# Altium schematic symbol library jlcpcb_2025_04_capacitors_extended_0805.schlib: 3281 symbols (part 15 of 18)
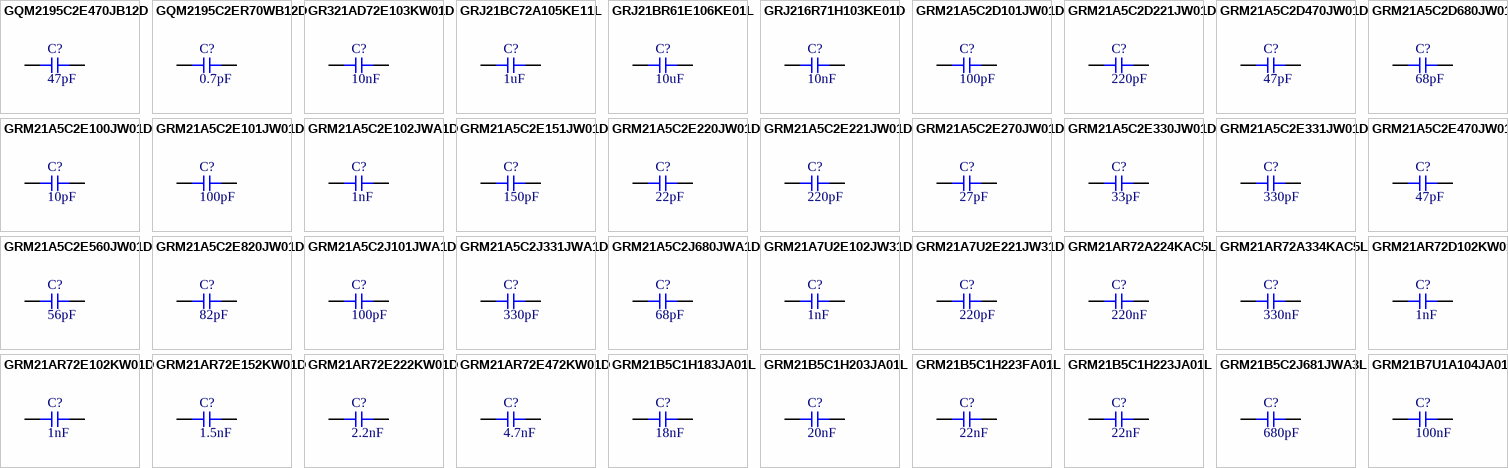
[diagram p96: symbols GQM2195C2E470JB12D to GRM21B7U1A104JA01L]

## GRM21A5C2E102JWA1D
designator C?  Capacitance: 1nF  (hidden comment: *)
Capacitor, Ceramic (MLCC), 1nF, ±5%, 250V, null, ±5%, SMD 0805; Manufacturer: Murata Electronics; Manufacturer Part Number: GRM21A5C2E102JWA1D; Package Size: 0805; JLCPCB Basic Part: No; JLCPCB Part Number: C909887; Supplier 1: LCSC; Category: Capacitors - MLCC; Supplier Part Number 1: C909887; Tolerance: ±5%; Voltage Rating: 250V; Temperature Coefficient: null; RoHS: Yes; ComponentLink1Description: Datasheet; ComponentLink1URL: https://wmsc.lcsc.com/wmsc/upload/file/pdf/v2/lcsc/2304140030_Murata-Electronics-GRM21A5C2E102JWA1D_C909887.pdf; ComponentLink2Description: JLCPCB Part URL; ComponentLink2URL: https://jlcpcb.com/partdetail/C909887; ComponentLink3Description: LCSC Part URL; ComponentLink3URL: https://lcsc.com/product-detail/Multilayer-Ceramic-Capacitors-MLCC---SMD-SMT_Murata-Electronics-Murata-Electronics-GRM21A5C2E102JWA1D_C909887.html
footprint CAP-0805 (0805 (2012M) Capacitor)
pins: 1, 2

## GRM21A5C2E151JW01D
designator C?  Capacitance: 150pF  (hidden comment: *)
Capacitor, Ceramic (MLCC), 150pF, ±5%, 250V, null, ±5%, SMD 0805; Manufacturer: Murata Electronics; Manufacturer Part Number: GRM21A5C2E151JW01D; Package Size: 0805; JLCPCB Basic Part: No; JLCPCB Part Number: C701191; Supplier 1: LCSC; Category: Capacitors - MLCC; Supplier Part Number 1: C701191; Tolerance: ±5%; Voltage Rating: 250V; Temperature Coefficient: null; RoHS: Yes; ComponentLink1Description: Datasheet; ComponentLink1URL: https://wmsc.lcsc.com/wmsc/upload/file/pdf/v2/lcsc/2011072005_Murata-Electronics-GRM21A5C2E151JW01D_C701191.pdf; ComponentLink2Description: JLCPCB Part URL; ComponentLink2URL: https://jlcpcb.com/partdetail/C701191; ComponentLink3Description: LCSC Part URL; ComponentLink3URL: https://lcsc.com/product-detail/Multilayer-Ceramic-Capacitors-MLCC---SMD-SMT_Murata-Electronics-Murata-Electronics-GRM21A5C2E151JW01D_C701191.html
footprint CAP-0805 (0805 (2012M) Capacitor)
pins: 1, 2

## GRM21A5C2E220JW01D
designator C?  Capacitance: 22pF  (hidden comment: *)
Capacitor, Ceramic (MLCC), 22pF, ±5%, 250V, null, ±5%, SMD 0805; Manufacturer: Murata Electronics; Manufacturer Part Number: GRM21A5C2E220JW01D; Package Size: 0805; JLCPCB Basic Part: No; JLCPCB Part Number: C668358; Supplier 1: LCSC; Category: Capacitors - MLCC; Supplier Part Number 1: C668358; Tolerance: ±5%; Voltage Rating: 250V; Temperature Coefficient: null; RoHS: Yes; ComponentLink1Description: Datasheet; ComponentLink1URL: https://wmsc.lcsc.com/wmsc/upload/file/pdf/v2/lcsc/2301311008_Murata-Electronics-GRM21A5C2E220JW01D_C668358.pdf; ComponentLink2Description: JLCPCB Part URL; ComponentLink2URL: https://jlcpcb.com/partdetail/C668358; ComponentLink3Description: LCSC Part URL; ComponentLink3URL: https://lcsc.com/product-detail/Multilayer-Ceramic-Capacitors-MLCC---SMD-SMT_Murata-Electronics-Murata-Electronics-GRM21A5C2E220JW01D_C668358.html
footprint CAP-0805 (0805 (2012M) Capacitor)
pins: 1, 2

## GRM21A5C2E221JW01D
designator C?  Capacitance: 220pF  (hidden comment: *)
Capacitor, Ceramic (MLCC), 220pF, ±5%, 250V, C0G, ±5%, SMD 0805; Manufacturer: Murata Electronics; Manufacturer Part Number: GRM21A5C2E221JW01D; Package Size: 0805; JLCPCB Basic Part: No; JLCPCB Part Number: C437547; Supplier 1: LCSC; Category: Capacitors - MLCC; Supplier Part Number 1: C437547; Tolerance: ±5%; Voltage Rating: 250V; Temperature Coefficient: C0G; RoHS: Yes; ComponentLink1Description: Datasheet; ComponentLink1URL: https://wmsc.lcsc.com/wmsc/upload/file/pdf/v2/lcsc/2001111409_Murata-Electronics-GRM21A5C2E221JW01D_C437547.pdf; ComponentLink2Description: JLCPCB Part URL; ComponentLink2URL: https://jlcpcb.com/partdetail/C437547; ComponentLink3Description: LCSC Part URL; ComponentLink3URL: https://lcsc.com/product-detail/Multilayer-Ceramic-Capacitors-MLCC---SMD-SMT_Murata-Electronics-Murata-Electronics-GRM21A5C2E221JW01D_C437547.html
footprint CAP-0805 (0805 (2012M) Capacitor)
pins: 1, 2

## GRM21A5C2E270JW01D
designator C?  Capacitance: 27pF  (hidden comment: *)
Capacitor, Ceramic (MLCC), 27pF, ±5%, 250V, C0G, ±5%, SMD 0805; Manufacturer: Murata Electronics; Manufacturer Part Number: GRM21A5C2E270JW01D; Package Size: 0805; JLCPCB Basic Part: No; JLCPCB Part Number: C710969; Supplier 1: LCSC; Category: Capacitors - MLCC; Supplier Part Number 1: C710969; Tolerance: ±5%; Voltage Rating: 250V; Temperature Coefficient: C0G; RoHS: Yes; ComponentLink1Description: Datasheet; ComponentLink1URL: https://wmsc.lcsc.com/wmsc/upload/file/pdf/v2/lcsc/2202161830_Murata-Electronics-GRM21A5C2E270JW01D_C710969.pdf; ComponentLink2Description: JLCPCB Part URL; ComponentLink2URL: https://jlcpcb.com/partdetail/C710969; ComponentLink3Description: LCSC Part URL; ComponentLink3URL: https://lcsc.com/product-detail/Multilayer-Ceramic-Capacitors-MLCC---SMD-SMT_Murata-Electronics-Murata-Electronics-GRM21A5C2E270JW01D_C710969.html
footprint CAP-0805 (0805 (2012M) Capacitor)
pins: 1, 2

## GRM21A5C2E330JW01D
designator C?  Capacitance: 33pF  (hidden comment: *)
Capacitor, Ceramic (MLCC), 33pF, ±5%, 250V, C0G, ±5%, SMD 0805; Manufacturer: Murata Electronics; Manufacturer Part Number: GRM21A5C2E330JW01D; Package Size: 0805; JLCPCB Basic Part: No; JLCPCB Part Number: C437548; Supplier 1: LCSC; Category: Capacitors - MLCC; Supplier Part Number 1: C437548; Tolerance: ±5%; Voltage Rating: 250V; Temperature Coefficient: C0G; RoHS: Yes; ComponentLink1Description: Datasheet; ComponentLink1URL: https://wmsc.lcsc.com/wmsc/upload/file/pdf/v2/lcsc/2304140030_Murata-Electronics-GRM21A5C2E330JW01D_C437548.pdf; ComponentLink2Description: JLCPCB Part URL; ComponentLink2URL: https://jlcpcb.com/partdetail/C437548; ComponentLink3Description: LCSC Part URL; ComponentLink3URL: https://lcsc.com/product-detail/Multilayer-Ceramic-Capacitors-MLCC---SMD-SMT_Murata-Electronics-Murata-Electronics-GRM21A5C2E330JW01D_C437548.html
footprint CAP-0805 (0805 (2012M) Capacitor)
pins: 1, 2

## GRM21A5C2E331JW01D
designator C?  Capacitance: 330pF  (hidden comment: *)
Capacitor, Ceramic (MLCC), 330pF, ±5%, 250V, C0G, ±5%, SMD 0805; Manufacturer: Murata Electronics; Manufacturer Part Number: GRM21A5C2E331JW01D; Package Size: 0805; JLCPCB Basic Part: No; JLCPCB Part Number: C162305; Supplier 1: LCSC; Category: Capacitors - MLCC; Supplier Part Number 1: C162305; Tolerance: ±5%; Voltage Rating: 250V; Temperature Coefficient: C0G; RoHS: Yes; ComponentLink1Description: Datasheet; ComponentLink1URL: https://wmsc.lcsc.com/wmsc/upload/file/pdf/v2/lcsc/2304140030_Murata-Electronics-GRM21A5C2E331JW01D_C162305.pdf; ComponentLink2Description: JLCPCB Part URL; ComponentLink2URL: https://jlcpcb.com/partdetail/C162305; ComponentLink3Description: LCSC Part URL; ComponentLink3URL: https://lcsc.com/product-detail/Multilayer-Ceramic-Capacitors-MLCC---SMD-SMT_Murata-Electronics-Murata-Electronics-GRM21A5C2E331JW01D_C162305.html
footprint CAP-0805 (0805 (2012M) Capacitor)
pins: 1, 2

## GRM21A5C2E470JW01D
designator C?  Capacitance: 47pF  (hidden comment: *)
Capacitor, Ceramic (MLCC), 47pF, ±5%, 250V, C0G, ±5%, SMD 0805; Manufacturer: Murata Electronics; Manufacturer Part Number: GRM21A5C2E470JW01D; Package Size: 0805; JLCPCB Basic Part: No; JLCPCB Part Number: C437549; Supplier 1: LCSC; Category: Capacitors - MLCC; Supplier Part Number 1: C437549; Tolerance: ±5%; Voltage Rating: 250V; Temperature Coefficient: C0G; RoHS: Yes; ComponentLink1Description: Datasheet; ComponentLink1URL: https://wmsc.lcsc.com/wmsc/upload/file/pdf/v2/lcsc/2304140030_Murata-Electronics-GRM21A5C2E470JW01D_C437549.pdf; ComponentLink2Description: JLCPCB Part URL; ComponentLink2URL: https://jlcpcb.com/partdetail/C437549; ComponentLink3Description: LCSC Part URL; ComponentLink3URL: https://lcsc.com/product-detail/Multilayer-Ceramic-Capacitors-MLCC---SMD-SMT_Murata-Electronics-Murata-Electronics-GRM21A5C2E470JW01D_C437549.html
footprint CAP-0805 (0805 (2012M) Capacitor)
pins: 1, 2

## GRM21A5C2E560JW01D
designator C?  Capacitance: 56pF  (hidden comment: *)
Capacitor, Ceramic (MLCC), 56pF, ±5%, 250V, null, ±5%, SMD 0805; Manufacturer: Murata Electronics; Manufacturer Part Number: GRM21A5C2E560JW01D; Package Size: 0805; JLCPCB Basic Part: No; JLCPCB Part Number: C913752; Supplier 1: LCSC; Category: Capacitors - MLCC; Supplier Part Number 1: C913752; Tolerance: ±5%; Voltage Rating: 250V; Temperature Coefficient: null; RoHS: Yes; ComponentLink1Description: Datasheet; ComponentLink1URL: https://wmsc.lcsc.com/wmsc/upload/file/pdf/v2/lcsc/2201131300_Murata-Electronics-GRM21A5C2E560JW01D_C913752.pdf; ComponentLink2Description: JLCPCB Part URL; ComponentLink2URL: https://jlcpcb.com/partdetail/C913752; ComponentLink3Description: LCSC Part URL; ComponentLink3URL: https://lcsc.com/product-detail/Multilayer-Ceramic-Capacitors-MLCC---SMD-SMT_Murata-Electronics-Murata-Electronics-GRM21A5C2E560JW01D_C913752.html
footprint CAP-0805 (0805 (2012M) Capacitor)
pins: 1, 2

## GRM21A5C2E820JW01D
designator C?  Capacitance: 82pF  (hidden comment: *)
Capacitor, Ceramic (MLCC), 82pF, ±5%, 250V, C0G, ±5%, SMD 0805; Manufacturer: Murata Electronics; Manufacturer Part Number: GRM21A5C2E820JW01D; Package Size: 0805; JLCPCB Basic Part: No; JLCPCB Part Number: C710971; Supplier 1: LCSC; Category: Capacitors - MLCC; Supplier Part Number 1: C710971; Tolerance: ±5%; Voltage Rating: 250V; Temperature Coefficient: C0G; RoHS: Yes; ComponentLink1Description: Datasheet; ComponentLink1URL: https://wmsc.lcsc.com/wmsc/upload/file/pdf/v2/lcsc/2210190600_Murata-Electronics-GRM21A5C2E820JW01D_C710971.pdf; ComponentLink2Description: JLCPCB Part URL; ComponentLink2URL: https://jlcpcb.com/partdetail/C710971; ComponentLink3Description: LCSC Part URL; ComponentLink3URL: https://lcsc.com/product-detail/Multilayer-Ceramic-Capacitors-MLCC---SMD-SMT_Murata-Electronics-Murata-Electronics-GRM21A5C2E820JW01D_C710971.html
footprint CAP-0805 (0805 (2012M) Capacitor)
pins: 1, 2

## GRM21A5C2J101JWA1D
designator C?  Capacitance: 100pF  (hidden comment: *)
Capacitor, Ceramic (MLCC), 100pF, ±5%, 630V, C0G, ±5%, SMD 0805; Manufacturer: Murata Electronics; Manufacturer Part Number: GRM21A5C2J101JWA1D; Package Size: 0805; JLCPCB Basic Part: No; JLCPCB Part Number: C437551; Supplier 1: LCSC; Category: Capacitors - MLCC; Supplier Part Number 1: C437551; Tolerance: ±5%; Voltage Rating: 630V; Temperature Coefficient: C0G; RoHS: Yes; ComponentLink1Description: Datasheet; ComponentLink1URL: https://wmsc.lcsc.com/wmsc/upload/file/pdf/v2/lcsc/2304140030_Murata-Electronics-GRM21A5C2J101JWA1D_C437551.pdf; ComponentLink2Description: JLCPCB Part URL; ComponentLink2URL: https://jlcpcb.com/partdetail/C437551; ComponentLink3Description: LCSC Part URL; ComponentLink3URL: https://lcsc.com/product-detail/Multilayer-Ceramic-Capacitors-MLCC---SMD-SMT_Murata-Electronics-Murata-Electronics-GRM21A5C2J101JWA1D_C437551.html
footprint CAP-0805 (0805 (2012M) Capacitor)
pins: 1, 2

## GRM21A5C2J331JWA1D
designator C?  Capacitance: 330pF  (hidden comment: *)
Capacitor, Ceramic (MLCC), 330pF, ±5%, ±5%, SMD 0805; Manufacturer: Murata Electronics; Manufacturer Part Number: GRM21A5C2J331JWA1D; Package Size: 0805; JLCPCB Basic Part: No; JLCPCB Part Number: C883569; Supplier 1: LCSC; Category: Capacitors - MLCC; Supplier Part Number 1: C883569; Tolerance: ±5%; RoHS: Yes; ComponentLink1Description: Datasheet; ComponentLink1URL: https://wmsc.lcsc.com/wmsc/upload/file/pdf/v2/lcsc/2304140030_Murata-Electronics-GRM21A5C2J331JWA1D_C883569.pdf; ComponentLink2Description: JLCPCB Part URL; ComponentLink2URL: https://jlcpcb.com/partdetail/C883569; ComponentLink3Description: LCSC Part URL; ComponentLink3URL: https://lcsc.com/product-detail/Multilayer-Ceramic-Capacitors-MLCC---SMD-SMT_Murata-Electronics-Murata-Electronics-GRM21A5C2J331JWA1D_C883569.html
footprint CAP-0805 (0805 (2012M) Capacitor)
pins: 1, 2

## GRM21A5C2J680JWA1D
designator C?  Capacitance: 68pF  (hidden comment: *)
Capacitor, Ceramic (MLCC), 68pF, ±5%, 630V, C0G, ±5%, SMD 0805; Manufacturer: Murata Electronics; Manufacturer Part Number: GRM21A5C2J680JWA1D; Package Size: 0805; JLCPCB Basic Part: No; JLCPCB Part Number: C162306; Supplier 1: LCSC; Category: Capacitors - MLCC; Supplier Part Number 1: C162306; Tolerance: ±5%; Voltage Rating: 630V; Temperature Coefficient: C0G; RoHS: Yes; ComponentLink1Description: Datasheet; ComponentLink1URL: https://wmsc.lcsc.com/wmsc/upload/file/pdf/v2/lcsc/1810201250_Murata-Electronics-GRM21A5C2J680JWA1D_C162306.pdf; ComponentLink2Description: JLCPCB Part URL; ComponentLink2URL: https://jlcpcb.com/partdetail/C162306; ComponentLink3Description: LCSC Part URL; ComponentLink3URL: https://lcsc.com/product-detail/Multilayer-Ceramic-Capacitors-MLCC---SMD-SMT_Murata-Electronics-Murata-Electronics-GRM21A5C2J680JWA1D_C162306.html
footprint CAP-0805 (0805 (2012M) Capacitor)
pins: 1, 2

## GRM21A7U2E102JW31D
designator C?  Capacitance: 1nF  (hidden comment: *)
Capacitor, Ceramic (MLCC), 1nF, ±5%, 250V, U2J, ±5%, SMD 0805; Manufacturer: Murata Electronics; Manufacturer Part Number: GRM21A7U2E102JW31D; Package Size: 0805; JLCPCB Basic Part: No; JLCPCB Part Number: C162307; Supplier 1: LCSC; Category: Capacitors - MLCC; Supplier Part Number 1: C162307; Tolerance: ±5%; Voltage Rating: 250V; Temperature Coefficient: U2J; RoHS: Yes; ComponentLink1Description: Datasheet; ComponentLink1URL: https://wmsc.lcsc.com/wmsc/upload/file/pdf/v2/lcsc/1810201241_Murata-Electronics-GRM21A7U2E102JW31D_C162307.pdf; ComponentLink2Description: JLCPCB Part URL; ComponentLink2URL: https://jlcpcb.com/partdetail/C162307; ComponentLink3Description: LCSC Part URL; ComponentLink3URL: https://lcsc.com/product-detail/Multilayer-Ceramic-Capacitors-MLCC---SMD-SMT_Murata-Electronics-Murata-Electronics-GRM21A7U2E102JW31D_C162307.html
footprint CAP-0805 (0805 (2012M) Capacitor)
pins: 1, 2

## GRM21A7U2E221JW31D
designator C?  Capacitance: 220pF  (hidden comment: *)
Capacitor, Ceramic (MLCC), 220pF, ±5%, 250V, U2J, ±5%, SMD 0805; Manufacturer: Murata Electronics; Manufacturer Part Number: GRM21A7U2E221JW31D; Package Size: 0805; JLCPCB Basic Part: No; JLCPCB Part Number: C426641; Supplier 1: LCSC; Category: Capacitors - MLCC; Supplier Part Number 1: C426641; Tolerance: ±5%; Voltage Rating: 250V; Temperature Coefficient: U2J; RoHS: Yes; ComponentLink1Description: Datasheet; ComponentLink1URL: https://wmsc.lcsc.com/wmsc/upload/file/pdf/v2/lcsc/2304140030_Murata-Electronics-GRM21A7U2E221JW31D_C426641.pdf; ComponentLink2Description: JLCPCB Part URL; ComponentLink2URL: https://jlcpcb.com/partdetail/C426641; ComponentLink3Description: LCSC Part URL; ComponentLink3URL: https://lcsc.com/product-detail/Multilayer-Ceramic-Capacitors-MLCC---SMD-SMT_Murata-Electronics-Murata-Electronics-GRM21A7U2E221JW31D_C426641.html
footprint CAP-0805 (0805 (2012M) Capacitor)
pins: 1, 2

## GRM21AR72A224KAC5L
designator C?  Capacitance: 220nF  (hidden comment: *)
Capacitor, Ceramic (MLCC), 220nF, ±10%, 100V, X7R, ±10%, SMD 0805; Manufacturer: Murata Electronics; Manufacturer Part Number: GRM21AR72A224KAC5L; Package Size: 0805; JLCPCB Basic Part: No; JLCPCB Part Number: C913663; Supplier 1: LCSC; Category: Capacitors - MLCC; Supplier Part Number 1: C913663; Tolerance: ±10%; Voltage Rating: 100V; Temperature Coefficient: X7R; RoHS: Yes; ComponentLink1Description: Datasheet; ComponentLink1URL: https://wmsc.lcsc.com/wmsc/upload/file/pdf/v2/lcsc/2201131300_Murata-Electronics-GRM21AR72A224KAC5L_C913663.pdf; ComponentLink2Description: JLCPCB Part URL; ComponentLink2URL: https://jlcpcb.com/partdetail/C913663; ComponentLink3Description: LCSC Part URL; ComponentLink3URL: https://lcsc.com/product-detail/Multilayer-Ceramic-Capacitors-MLCC---SMD-SMT_Murata-Electronics-Murata-Electronics-GRM21AR72A224KAC5L_C913663.html
footprint CAP-0805 (0805 (2012M) Capacitor)
pins: 1, 2

## GRM21AR72A334KAC5L
designator C?  Capacitance: 330nF  (hidden comment: *)
Capacitor, Ceramic (MLCC), 330nF, ±10%, 100V, X7R, ±10%, SMD 0805; Manufacturer: Murata Electronics; Manufacturer Part Number: GRM21AR72A334KAC5L; Package Size: 0805; JLCPCB Basic Part: No; JLCPCB Part Number: C710977; Supplier 1: LCSC; Category: Capacitors - MLCC; Supplier Part Number 1: C710977; Tolerance: ±10%; Voltage Rating: 100V; Temperature Coefficient: X7R; RoHS: Yes; ComponentLink1Description: Datasheet; ComponentLink1URL: https://wmsc.lcsc.com/wmsc/upload/file/pdf/v2/lcsc/2203092030_Murata-Electronics-GRM21AR72A334KAC5L_C710977.pdf; ComponentLink2Description: JLCPCB Part URL; ComponentLink2URL: https://jlcpcb.com/partdetail/C710977; ComponentLink3Description: LCSC Part URL; ComponentLink3URL: https://lcsc.com/product-detail/Multilayer-Ceramic-Capacitors-MLCC---SMD-SMT_Murata-Electronics-Murata-Electronics-GRM21AR72A334KAC5L_C710977.html
footprint CAP-0805 (0805 (2012M) Capacitor)
pins: 1, 2

## GRM21AR72D102KW01D
designator C?  Capacitance: 1nF  (hidden comment: *)
Capacitor, Ceramic (MLCC), 1nF, ±10%, 200V, X7R, ±10%, SMD 0805; Manufacturer: Murata Electronics; Manufacturer Part Number: GRM21AR72D102KW01D; Package Size: 0805; JLCPCB Basic Part: No; JLCPCB Part Number: C162310; Supplier 1: LCSC; Category: Capacitors - MLCC; Supplier Part Number 1: C162310; Tolerance: ±10%; Voltage Rating: 200V; Temperature Coefficient: X7R; RoHS: Yes; ComponentLink1Description: Datasheet; ComponentLink1URL: https://wmsc.lcsc.com/wmsc/upload/file/pdf/v2/lcsc/2304140030_Murata-Electronics-GRM21AR72D102KW01D_C162310.pdf; ComponentLink2Description: JLCPCB Part URL; ComponentLink2URL: https://jlcpcb.com/partdetail/C162310; ComponentLink3Description: LCSC Part URL; ComponentLink3URL: https://lcsc.com/product-detail/Multilayer-Ceramic-Capacitors-MLCC---SMD-SMT_Murata-Electronics-Murata-Electronics-GRM21AR72D102KW01D_C162310.html
footprint CAP-0805 (0805 (2012M) Capacitor)
pins: 1, 2

## GRM21AR72E102KW01D
designator C?  Capacitance: 1nF  (hidden comment: *)
Capacitor, Ceramic (MLCC), 1nF, ±10%, 250V, X7R, ±10%, SMD 0805; Manufacturer: Murata Electronics; Manufacturer Part Number: GRM21AR72E102KW01D; Package Size: 0805; JLCPCB Basic Part: No; JLCPCB Part Number: C97911; Supplier 1: LCSC; Category: Capacitors - MLCC; Supplier Part Number 1: C97911; Tolerance: ±10%; Voltage Rating: 250V; Temperature Coefficient: X7R; RoHS: Yes; ComponentLink1Description: Datasheet; ComponentLink1URL: https://wmsc.lcsc.com/wmsc/upload/file/pdf/v2/lcsc/1811142010_Murata-Electronics-GRM21AR72E102KW01D_C97911.pdf; ComponentLink2Description: JLCPCB Part URL; ComponentLink2URL: https://jlcpcb.com/partdetail/C97911; ComponentLink3Description: LCSC Part URL; ComponentLink3URL: https://lcsc.com/product-detail/Multilayer-Ceramic-Capacitors-MLCC---SMD-SMT_Murata-Electronics-Murata-Electronics-GRM21AR72E102KW01D_C97911.html
footprint CAP-0805 (0805 (2012M) Capacitor)
pins: 1, 2

## GRM21AR72E152KW01D
designator C?  Capacitance: 1.5nF  (hidden comment: *)
Capacitor, Ceramic (MLCC), 1.5nF, ±10%, 250V, X7R, ±10%, SMD 0805; Manufacturer: Murata Electronics; Manufacturer Part Number: GRM21AR72E152KW01D; Package Size: 0805; JLCPCB Basic Part: No; JLCPCB Part Number: C185517; Supplier 1: LCSC; Category: Capacitors - MLCC; Supplier Part Number 1: C185517; Tolerance: ±10%; Voltage Rating: 250V; Temperature Coefficient: X7R; RoHS: Yes; ComponentLink1Description: Datasheet; ComponentLink1URL: https://wmsc.lcsc.com/wmsc/upload/file/pdf/v2/lcsc/2304140030_Murata-Electronics-GRM21AR72E152KW01D_C185517.pdf; ComponentLink2Description: JLCPCB Part URL; ComponentLink2URL: https://jlcpcb.com/partdetail/C185517; ComponentLink3Description: LCSC Part URL; ComponentLink3URL: https://lcsc.com/product-detail/Multilayer-Ceramic-Capacitors-MLCC---SMD-SMT_Murata-Electronics-Murata-Electronics-GRM21AR72E152KW01D_C185517.html
footprint CAP-0805 (0805 (2012M) Capacitor)
pins: 1, 2

## GRM21AR72E222KW01D
designator C?  Capacitance: 2.2nF  (hidden comment: *)
Capacitor, Ceramic (MLCC), 2.2nF, ±10%, 250V, X7R, ±10%, SMD 0805; Manufacturer: Murata Electronics; Manufacturer Part Number: GRM21AR72E222KW01D; Package Size: 0805; JLCPCB Basic Part: No; JLCPCB Part Number: C415382; Supplier 1: LCSC; Category: Capacitors - MLCC; Supplier Part Number 1: C415382; Tolerance: ±10%; Voltage Rating: 250V; Temperature Coefficient: X7R; RoHS: Yes; ComponentLink1Description: Datasheet; ComponentLink1URL: https://wmsc.lcsc.com/wmsc/upload/file/pdf/v2/lcsc/2304140030_Murata-Electronics-GRM21AR72E222KW01D_C415382.pdf; ComponentLink2Description: JLCPCB Part URL; ComponentLink2URL: https://jlcpcb.com/partdetail/C415382; ComponentLink3Description: LCSC Part URL; ComponentLink3URL: https://lcsc.com/product-detail/Multilayer-Ceramic-Capacitors-MLCC---SMD-SMT_Murata-Electronics-Murata-Electronics-GRM21AR72E222KW01D_C415382.html
footprint CAP-0805 (0805 (2012M) Capacitor)
pins: 1, 2

## GRM21AR72E472KW01D
designator C?  Capacitance: 4.7nF  (hidden comment: *)
Capacitor, Ceramic (MLCC), 4.7nF, ±10%, 250V, X7R, ±10%, SMD 0805; Manufacturer: Murata Electronics; Manufacturer Part Number: GRM21AR72E472KW01D; Package Size: 0805; JLCPCB Basic Part: No; JLCPCB Part Number: C415395; Supplier 1: LCSC; Category: Capacitors - MLCC; Supplier Part Number 1: C415395; Tolerance: ±10%; Voltage Rating: 250V; Temperature Coefficient: X7R; RoHS: Yes; ComponentLink1Description: Datasheet; ComponentLink1URL: https://wmsc.lcsc.com/wmsc/upload/file/pdf/v2/lcsc/2304140030_Murata-Electronics-GRM21AR72E472KW01D_C415395.pdf; ComponentLink2Description: JLCPCB Part URL; ComponentLink2URL: https://jlcpcb.com/partdetail/C415395; ComponentLink3Description: LCSC Part URL; ComponentLink3URL: https://lcsc.com/product-detail/Multilayer-Ceramic-Capacitors-MLCC---SMD-SMT_Murata-Electronics-Murata-Electronics-GRM21AR72E472KW01D_C415395.html
footprint CAP-0805 (0805 (2012M) Capacitor)
pins: 1, 2

## GRM21B5C1H183JA01L
designator C?  Capacitance: 18nF  (hidden comment: *)
Capacitor, Ceramic (MLCC), 18nF, ±5%, 50V, C0G, ±5%, SMD 0805; Manufacturer: Murata Electronics; Manufacturer Part Number: GRM21B5C1H183JA01L; Package Size: 0805; JLCPCB Basic Part: No; JLCPCB Part Number: C162313; Supplier 1: LCSC; Category: Capacitors - MLCC; Supplier Part Number 1: C162313; Tolerance: ±5%; Voltage Rating: 50V; Temperature Coefficient: C0G; RoHS: Yes; ComponentLink1Description: Datasheet; ComponentLink1URL: https://wmsc.lcsc.com/wmsc/upload/file/pdf/v2/lcsc/1810201242_Murata-Electronics-GRM21B5C1H183JA01L_C162313.pdf; ComponentLink2Description: JLCPCB Part URL; ComponentLink2URL: https://jlcpcb.com/partdetail/C162313; ComponentLink3Description: LCSC Part URL; ComponentLink3URL: https://lcsc.com/product-detail/Multilayer-Ceramic-Capacitors-MLCC---SMD-SMT_Murata-Electronics-Murata-Electronics-GRM21B5C1H183JA01L_C162313.html
footprint CAP-0805 (0805 (2012M) Capacitor)
pins: 1, 2

## GRM21B5C1H203JA01L
designator C?  Capacitance: 20nF  (hidden comment: *)
Capacitor, Ceramic (MLCC), 20nF, ±5%, 50V, null, ±5%, SMD 0805; Manufacturer: Murata Electronics; Manufacturer Part Number: GRM21B5C1H203JA01L; Package Size: 0805; JLCPCB Basic Part: No; JLCPCB Part Number: C2170407; Supplier 1: LCSC; Category: Capacitors - MLCC; Supplier Part Number 1: C2170407; Tolerance: ±5%; Voltage Rating: 50V; Temperature Coefficient: null; RoHS: Yes; ComponentLink1Description: Datasheet; ComponentLink1URL: https://wmsc.lcsc.com/wmsc/upload/file/pdf/v2/lcsc/2202040430_Murata-Electronics-GRM21B5C1H203JA01L_C2170407.pdf; ComponentLink2Description: JLCPCB Part URL; ComponentLink2URL: https://jlcpcb.com/partdetail/C2170407; ComponentLink3Description: LCSC Part URL; ComponentLink3URL: https://lcsc.com/product-detail/Multilayer-Ceramic-Capacitors-MLCC---SMD-SMT_Murata-Electronics-Murata-Electronics-GRM21B5C1H203JA01L_C2170407.html
footprint CAP-0805 (0805 (2012M) Capacitor)
pins: 1, 2

## GRM21B5C1H223FA01L
designator C?  Capacitance: 22nF  (hidden comment: *)
Capacitor, Ceramic (MLCC), 22nF, ±1%, 50V, null, ±1%, SMD 0805; Manufacturer: Murata Electronics; Manufacturer Part Number: GRM21B5C1H223FA01L; Package Size: 0805; JLCPCB Basic Part: No; JLCPCB Part Number: C2181592; Supplier 1: LCSC; Category: Capacitors - MLCC; Supplier Part Number 1: C2181592; Tolerance: ±1%; Voltage Rating: 50V; Temperature Coefficient: null; RoHS: Yes; ComponentLink1Description: Datasheet; ComponentLink1URL: https://wmsc.lcsc.com/wmsc/upload/file/pdf/v2/lcsc/2401181239_Murata-Electronics-GRM21B5C1H223FA01L_C2181592.pdf; ComponentLink2Description: JLCPCB Part URL; ComponentLink2URL: https://jlcpcb.com/partdetail/C2181592; ComponentLink3Description: LCSC Part URL; ComponentLink3URL: https://lcsc.com/product-detail/Multilayer-Ceramic-Capacitors-MLCC---SMD-SMT_Murata-Electronics-Murata-Electronics-GRM21B5C1H223FA01L_C2181592.html
footprint CAP-0805 (0805 (2012M) Capacitor)
pins: 1, 2

## GRM21B5C1H223JA01L
designator C?  Capacitance: 22nF  (hidden comment: *)
Capacitor, Ceramic (MLCC), 22nF, ±5%, 50V, C0G, ±5%, SMD 0805; Manufacturer: Murata Electronics; Manufacturer Part Number: GRM21B5C1H223JA01L; Package Size: 0805; JLCPCB Basic Part: No; JLCPCB Part Number: C77069; Supplier 1: LCSC; Category: Capacitors - MLCC; Supplier Part Number 1: C77069; Tolerance: ±5%; Voltage Rating: 50V; Temperature Coefficient: C0G; RoHS: Yes; ComponentLink1Description: Datasheet; ComponentLink1URL: https://wmsc.lcsc.com/wmsc/upload/file/pdf/v2/lcsc/2304140030_Murata-Electronics-GRM21B5C1H223JA01L_C77069.pdf; ComponentLink2Description: JLCPCB Part URL; ComponentLink2URL: https://jlcpcb.com/partdetail/C77069; ComponentLink3Description: LCSC Part URL; ComponentLink3URL: https://lcsc.com/product-detail/Multilayer-Ceramic-Capacitors-MLCC---SMD-SMT_Murata-Electronics-Murata-Electronics-GRM21B5C1H223JA01L_C77069.html
footprint CAP-0805 (0805 (2012M) Capacitor)
pins: 1, 2

## GRM21B5C2J681JWA3L
designator C?  Capacitance: 680pF  (hidden comment: *)
Capacitor, Ceramic (MLCC), 680pF, ±5%, 630V, C0G, ±5%, SMD 0805; Manufacturer: Murata Electronics; Manufacturer Part Number: GRM21B5C2J681JWA3L; Package Size: 0805; JLCPCB Basic Part: No; JLCPCB Part Number: C162314; Supplier 1: LCSC; Category: Capacitors - MLCC; Supplier Part Number 1: C162314; Tolerance: ±5%; Voltage Rating: 630V; Temperature Coefficient: C0G; RoHS: Yes; ComponentLink1Description: Datasheet; ComponentLink1URL: https://wmsc.lcsc.com/wmsc/upload/file/pdf/v2/lcsc/1810201234_Murata-Electronics-GRM21B5C2J681JWA3L_C162314.pdf; ComponentLink2Description: JLCPCB Part URL; ComponentLink2URL: https://jlcpcb.com/partdetail/C162314; ComponentLink3Description: LCSC Part URL; ComponentLink3URL: https://lcsc.com/product-detail/Multilayer-Ceramic-Capacitors-MLCC---SMD-SMT_Murata-Electronics-Murata-Electronics-GRM21B5C2J681JWA3L_C162314.html
footprint CAP-0805 (0805 (2012M) Capacitor)
pins: 1, 2

## GRM21B7U1A104JA01L
designator C?  Capacitance: 100nF  (hidden comment: *)
Capacitor, Ceramic (MLCC), 100nF, ±5%, 10V, U2J, ±5%, SMD 0805; Manufacturer: Murata Electronics; Manufacturer Part Number: GRM21B7U1A104JA01L; Package Size: 0805; JLCPCB Basic Part: No; JLCPCB Part Number: C710980; Supplier 1: LCSC; Category: Capacitors - MLCC; Supplier Part Number 1: C710980; Tolerance: ±5%; Voltage Rating: 10V; Temperature Coefficient: U2J; RoHS: Yes; ComponentLink1Description: Datasheet; ComponentLink1URL: https://wmsc.lcsc.com/wmsc/upload/file/pdf/v2/lcsc/2101281807_Murata-Electronics-GRM21B7U1A104JA01L_C710980.pdf; ComponentLink2Description: JLCPCB Part URL; ComponentLink2URL: https://jlcpcb.com/partdetail/C710980; ComponentLink3Description: LCSC Part URL; ComponentLink3URL: https://lcsc.com/product-detail/Multilayer-Ceramic-Capacitors-MLCC---SMD-SMT_Murata-Electronics-Murata-Electronics-GRM21B7U1A104JA01L_C710980.html
footprint CAP-0805 (0805 (2012M) Capacitor)
pins: 1, 2

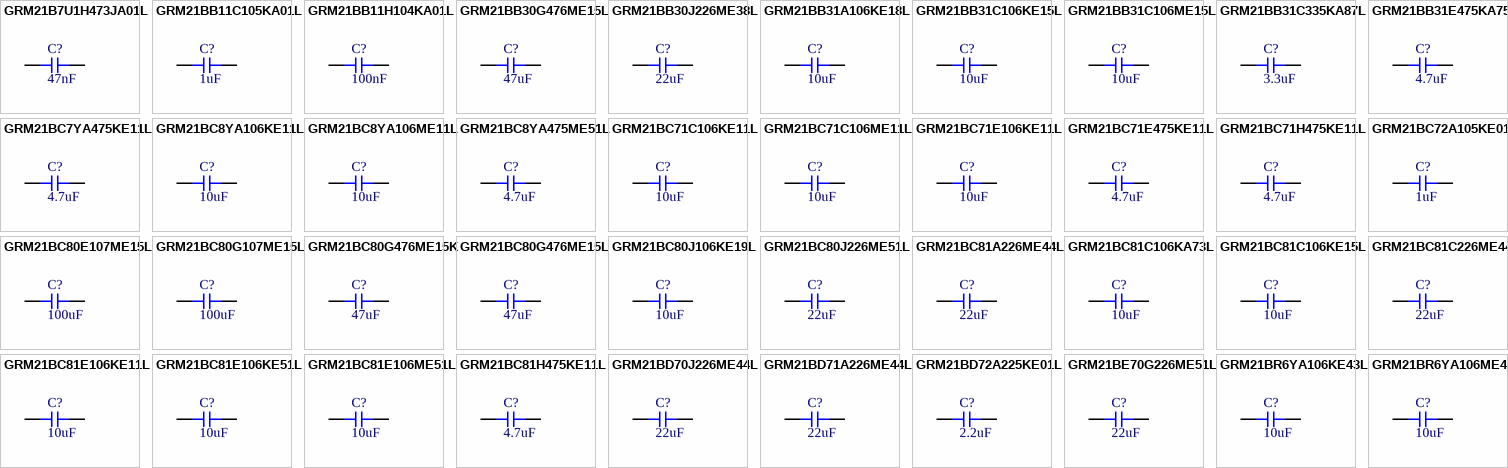
[diagram p65: symbols GRM21B7U1H473JA01L to GRM21BR6YA106ME43L]

## GRM21B7U1H473JA01L
designator C?  Capacitance: 47nF  (hidden comment: *)
Capacitor, Ceramic (MLCC), 47nF, ±5%, 50V, U2J, ±5%, SMD 0805; Manufacturer: Murata Electronics; Manufacturer Part Number: GRM21B7U1H473JA01L; Package Size: 0805; JLCPCB Basic Part: No; JLCPCB Part Number: C426655; Supplier 1: LCSC; Category: Capacitors - MLCC; Supplier Part Number 1: C426655; Tolerance: ±5%; Voltage Rating: 50V; Temperature Coefficient: U2J; RoHS: Yes; ComponentLink1Description: Datasheet; ComponentLink1URL: https://wmsc.lcsc.com/wmsc/upload/file/pdf/v2/lcsc/2304140030_Murata-Electronics-GRM21B7U1H473JA01L_C426655.pdf; ComponentLink2Description: JLCPCB Part URL; ComponentLink2URL: https://jlcpcb.com/partdetail/C426655; ComponentLink3Description: LCSC Part URL; ComponentLink3URL: https://lcsc.com/product-detail/Multilayer-Ceramic-Capacitors-MLCC---SMD-SMT_Murata-Electronics-Murata-Electronics-GRM21B7U1H473JA01L_C426655.html
footprint CAP-0805 (0805 (2012M) Capacitor)
pins: 1, 2

## GRM21BB11C105KA01L
designator C?  Capacitance: 1uF  (hidden comment: *)
Capacitor, Ceramic (MLCC), 1uF, ±10%, 16V, B, ±10%, SMD 0805; Manufacturer: Murata Electronics; Manufacturer Part Number: GRM21BB11C105KA01L; Package Size: 0805; JLCPCB Basic Part: No; JLCPCB Part Number: C527996; Supplier 1: LCSC; Category: Capacitors - MLCC; Supplier Part Number 1: C527996; Tolerance: ±10%; Voltage Rating: 16V; Temperature Coefficient: B; RoHS: Yes; ComponentLink1Description: Datasheet; ComponentLink1URL: https://wmsc.lcsc.com/wmsc/upload/file/pdf/v2/lcsc/2006031232_Murata-Electronics-GRM21BB11C105KA01L_C527996.pdf; ComponentLink2Description: JLCPCB Part URL; ComponentLink2URL: https://jlcpcb.com/partdetail/C527996; ComponentLink3Description: LCSC Part URL; ComponentLink3URL: https://lcsc.com/product-detail/Multilayer-Ceramic-Capacitors-MLCC---SMD-SMT_Murata-Electronics-Murata-Electronics-GRM21BB11C105KA01L_C527996.html
footprint CAP-0805 (0805 (2012M) Capacitor)
pins: 1, 2

## GRM21BB11H104KA01L
designator C?  Capacitance: 100nF  (hidden comment: *)
Capacitor, Ceramic (MLCC), 100nF, ±10%, 50V, B, ±10%, SMD 0805; Manufacturer: Murata Electronics; Manufacturer Part Number: GRM21BB11H104KA01L; Package Size: 0805; JLCPCB Basic Part: No; JLCPCB Part Number: C464405; Supplier 1: LCSC; Category: Capacitors - MLCC; Supplier Part Number 1: C464405; Tolerance: ±10%; Voltage Rating: 50V; Temperature Coefficient: B; RoHS: Yes; ComponentLink1Description: Datasheet; ComponentLink1URL: https://wmsc.lcsc.com/wmsc/upload/file/pdf/v2/lcsc/2304140030_Murata-Electronics-GRM21BB11H104KA01L_C464405.pdf; ComponentLink2Description: JLCPCB Part URL; ComponentLink2URL: https://jlcpcb.com/partdetail/C464405; ComponentLink3Description: LCSC Part URL; ComponentLink3URL: https://lcsc.com/product-detail/Multilayer-Ceramic-Capacitors-MLCC---SMD-SMT_Murata-Electronics-Murata-Electronics-GRM21BB11H104KA01L_C464405.html
footprint CAP-0805 (0805 (2012M) Capacitor)
pins: 1, 2

## GRM21BB30G476ME15L
designator C?  Capacitance: 47uF  (hidden comment: *)
Capacitor, Ceramic (MLCC), 47uF, ±20%, 4V, B, ±20%, SMD 0805; Manufacturer: Murata Electronics; Manufacturer Part Number: GRM21BB30G476ME15L; Package Size: 0805; JLCPCB Basic Part: No; JLCPCB Part Number: C471389; Supplier 1: LCSC; Category: Capacitors - MLCC; Supplier Part Number 1: C471389; Tolerance: ±20%; Voltage Rating: 4V; Temperature Coefficient: B; RoHS: Yes; ComponentLink1Description: Datasheet; ComponentLink1URL: https://wmsc.lcsc.com/wmsc/upload/file/pdf/v2/lcsc/2001081823_Murata-Electronics-GRM21BB30G476ME15L_C471389.pdf; ComponentLink2Description: JLCPCB Part URL; ComponentLink2URL: https://jlcpcb.com/partdetail/C471389; ComponentLink3Description: LCSC Part URL; ComponentLink3URL: https://lcsc.com/product-detail/Multilayer-Ceramic-Capacitors-MLCC---SMD-SMT_Murata-Electronics-Murata-Electronics-GRM21BB30G476ME15L_C471389.html
footprint CAP-0805 (0805 (2012M) Capacitor)
pins: 1, 2

## GRM21BB30J226ME38L
designator C?  Capacitance: 22uF  (hidden comment: *)
Capacitor, Ceramic (MLCC), 22uF, ±20%, 6.3V, ±20%, SMD 0805; Manufacturer: Murata Electronics; Manufacturer Part Number: GRM21BB30J226ME38L; Package Size: 0805; JLCPCB Basic Part: No; JLCPCB Part Number: C389006; Supplier 1: LCSC; Category: Capacitors - MLCC; Supplier Part Number 1: C389006; Tolerance: ±20%; Voltage Rating: 6.3V; RoHS: Yes; ComponentLink1Description: Datasheet; ComponentLink1URL: https://wmsc.lcsc.com/wmsc/upload/file/pdf/v2/lcsc/2109092030_Murata-Electronics-GRM21BB30J226ME38L_C389006.pdf; ComponentLink2Description: JLCPCB Part URL; ComponentLink2URL: https://jlcpcb.com/partdetail/C389006; ComponentLink3Description: LCSC Part URL; ComponentLink3URL: https://lcsc.com/product-detail/Multilayer-Ceramic-Capacitors-MLCC---SMD-SMT_Murata-Electronics-Murata-Electronics-GRM21BB30J226ME38L_C389006.html
footprint CAP-0805 (0805 (2012M) Capacitor)
pins: 1, 2

## GRM21BB31A106KE18L
designator C?  Capacitance: 10uF  (hidden comment: *)
Capacitor, Ceramic (MLCC), 10uF, ±10%, 10V, B, ±10%, SMD 0805; Manufacturer: Murata Electronics; Manufacturer Part Number: GRM21BB31A106KE18L; Package Size: 0805; JLCPCB Basic Part: No; JLCPCB Part Number: C162316; Supplier 1: LCSC; Category: Capacitors - MLCC; Supplier Part Number 1: C162316; Tolerance: ±10%; Voltage Rating: 10V; Temperature Coefficient: B; RoHS: Yes; ComponentLink1Description: Datasheet; ComponentLink1URL: https://wmsc.lcsc.com/wmsc/upload/file/pdf/v2/lcsc/1912111437_Murata-Electronics-GRM21BB31A106KE18L_C162316.pdf; ComponentLink2Description: JLCPCB Part URL; ComponentLink2URL: https://jlcpcb.com/partdetail/C162316; ComponentLink3Description: LCSC Part URL; ComponentLink3URL: https://lcsc.com/product-detail/Multilayer-Ceramic-Capacitors-MLCC---SMD-SMT_Murata-Electronics-Murata-Electronics-GRM21BB31A106KE18L_C162316.html
footprint CAP-0805 (0805 (2012M) Capacitor)
pins: 1, 2

## GRM21BB31C106KE15L
designator C?  Capacitance: 10uF  (hidden comment: *)
Capacitor, Ceramic (MLCC), 10uF, ±10%, 16V, B, ±10%, SMD 0805; Manufacturer: Murata Electronics; Manufacturer Part Number: GRM21BB31C106KE15L; Package Size: 0805; JLCPCB Basic Part: No; JLCPCB Part Number: C162317; Supplier 1: LCSC; Category: Capacitors - MLCC; Supplier Part Number 1: C162317; Tolerance: ±10%; Voltage Rating: 16V; Temperature Coefficient: B; RoHS: Yes; ComponentLink1Description: Datasheet; ComponentLink1URL: https://wmsc.lcsc.com/wmsc/upload/file/pdf/v2/lcsc/2304140030_Murata-Electronics-GRM21BB31C106KE15L_C162317.pdf; ComponentLink2Description: JLCPCB Part URL; ComponentLink2URL: https://jlcpcb.com/partdetail/C162317; ComponentLink3Description: LCSC Part URL; ComponentLink3URL: https://lcsc.com/product-detail/Multilayer-Ceramic-Capacitors-MLCC---SMD-SMT_Murata-Electronics-Murata-Electronics-GRM21BB31C106KE15L_C162317.html
footprint CAP-0805 (0805 (2012M) Capacitor)
pins: 1, 2

## GRM21BB31C106ME15L
designator C?  Capacitance: 10uF  (hidden comment: *)
Capacitor, Ceramic (MLCC), 10uF, ±20%, ±20%, SMD 0805; Manufacturer: Murata Electronics; Manufacturer Part Number: GRM21BB31C106ME15L; Package Size: 0805; JLCPCB Basic Part: No; JLCPCB Part Number: C692636; Supplier 1: LCSC; Category: Capacitors - MLCC; Supplier Part Number 1: C692636; Tolerance: ±20%; RoHS: Yes; ComponentLink1Description: Datasheet; ComponentLink1URL: https://wmsc.lcsc.com/wmsc/upload/file/pdf/v2/lcsc/2308111811_Murata-Electronics-GRM21BB31C106ME15L_C692636.pdf; ComponentLink2Description: JLCPCB Part URL; ComponentLink2URL: https://jlcpcb.com/partdetail/C692636; ComponentLink3Description: LCSC Part URL; ComponentLink3URL: https://lcsc.com/product-detail/Multilayer-Ceramic-Capacitors-MLCC---SMD-SMT_Murata-Electronics-Murata-Electronics-GRM21BB31C106ME15L_C692636.html
footprint CAP-0805 (0805 (2012M) Capacitor)
pins: 1, 2

## GRM21BB31C335KA87L
designator C?  Capacitance: 3.3uF  (hidden comment: *)
Capacitor, Ceramic (MLCC), 3.3uF, ±10%, 16V, B, ±10%, SMD 0805; Manufacturer: Murata Electronics; Manufacturer Part Number: GRM21BB31C335KA87L; Package Size: 0805; JLCPCB Basic Part: No; JLCPCB Part Number: C464440; Supplier 1: LCSC; Category: Capacitors - MLCC; Supplier Part Number 1: C464440; Tolerance: ±10%; Voltage Rating: 16V; Temperature Coefficient: B; RoHS: Yes; ComponentLink1Description: Datasheet; ComponentLink1URL: https://wmsc.lcsc.com/wmsc/upload/file/pdf/v2/lcsc/2304140030_Murata-Electronics-GRM21BB31C335KA87L_C464440.pdf; ComponentLink2Description: JLCPCB Part URL; ComponentLink2URL: https://jlcpcb.com/partdetail/C464440; ComponentLink3Description: LCSC Part URL; ComponentLink3URL: https://lcsc.com/product-detail/Multilayer-Ceramic-Capacitors-MLCC---SMD-SMT_Murata-Electronics-Murata-Electronics-GRM21BB31C335KA87L_C464440.html
footprint CAP-0805 (0805 (2012M) Capacitor)
pins: 1, 2

## GRM21BB31E475KA75L
designator C?  Capacitance: 4.7uF  (hidden comment: *)
Capacitor, Ceramic (MLCC), 4.7uF, ±10%, ±10%, SMD 0805; Manufacturer: Murata Electronics; Manufacturer Part Number: GRM21BB31E475KA75L; Package Size: 0805; JLCPCB Basic Part: No; JLCPCB Part Number: C576489; Supplier 1: LCSC; Category: Capacitors - MLCC; Supplier Part Number 1: C576489; Tolerance: ±10%; RoHS: Yes; ComponentLink1Description: Datasheet; ComponentLink1URL: https://wmsc.lcsc.com/wmsc/upload/file/pdf/v2/lcsc/2105241310_Murata-Electronics-GRM21BB31E475KA75L_C576489.pdf; ComponentLink2Description: JLCPCB Part URL; ComponentLink2URL: https://jlcpcb.com/partdetail/C576489; ComponentLink3Description: LCSC Part URL; ComponentLink3URL: https://lcsc.com/product-detail/Multilayer-Ceramic-Capacitors-MLCC---SMD-SMT_Murata-Electronics-Murata-Electronics-GRM21BB31E475KA75L_C576489.html
footprint CAP-0805 (0805 (2012M) Capacitor)
pins: 1, 2

## GRM21BC7YA475KE11L
designator C?  Capacitance: 4.7uF  (hidden comment: *)
Capacitor, Ceramic (MLCC), 4.7uF, ±10%, 35V, X7S, ±10%, SMD 0805; Manufacturer: Murata Electronics; Manufacturer Part Number: GRM21BC7YA475KE11L; Package Size: 0805; JLCPCB Basic Part: No; JLCPCB Part Number: C710985; Supplier 1: LCSC; Category: Capacitors - MLCC; Supplier Part Number 1: C710985; Tolerance: ±10%; Voltage Rating: 35V; Temperature Coefficient: X7S; RoHS: Yes; ComponentLink1Description: Datasheet; ComponentLink1URL: https://wmsc.lcsc.com/wmsc/upload/file/pdf/v2/lcsc/2210190600_Murata-Electronics-GRM21BC7YA475KE11L_C710985.pdf; ComponentLink2Description: JLCPCB Part URL; ComponentLink2URL: https://jlcpcb.com/partdetail/C710985; ComponentLink3Description: LCSC Part URL; ComponentLink3URL: https://lcsc.com/product-detail/Multilayer-Ceramic-Capacitors-MLCC---SMD-SMT_Murata-Electronics-Murata-Electronics-GRM21BC7YA475KE11L_C710985.html
footprint CAP-0805 (0805 (2012M) Capacitor)
pins: 1, 2

## GRM21BC8YA106KE11L
designator C?  Capacitance: 10uF  (hidden comment: *)
Capacitor, Ceramic (MLCC), 10uF, ±10%, 35V, X6S, ±10%, SMD 0805; Manufacturer: Murata Electronics; Manufacturer Part Number: GRM21BC8YA106KE11L; Package Size: 0805; JLCPCB Basic Part: No; JLCPCB Part Number: C469541; Supplier 1: LCSC; Category: Capacitors - MLCC; Supplier Part Number 1: C469541; Tolerance: ±10%; Voltage Rating: 35V; Temperature Coefficient: X6S; RoHS: Yes; ComponentLink1Description: Datasheet; ComponentLink1URL: https://wmsc.lcsc.com/wmsc/upload/file/pdf/v2/lcsc/2003111508_Murata-Electronics-GRM21BC8YA106KE11L_C469541.pdf; ComponentLink2Description: JLCPCB Part URL; ComponentLink2URL: https://jlcpcb.com/partdetail/C469541; ComponentLink3Description: LCSC Part URL; ComponentLink3URL: https://lcsc.com/product-detail/Multilayer-Ceramic-Capacitors-MLCC---SMD-SMT_Murata-Electronics-Murata-Electronics-GRM21BC8YA106KE11L_C469541.html
footprint CAP-0805 (0805 (2012M) Capacitor)
pins: 1, 2

## GRM21BC8YA106ME11L
designator C?  Capacitance: 10uF  (hidden comment: *)
Capacitor, Ceramic (MLCC), 10uF, ±20%, 35V, X6S, ±20%, SMD 0805; Manufacturer: Murata Electronics; Manufacturer Part Number: GRM21BC8YA106ME11L; Package Size: 0805; JLCPCB Basic Part: No; JLCPCB Part Number: C710990; Supplier 1: LCSC; Category: Capacitors - MLCC; Supplier Part Number 1: C710990; Tolerance: ±20%; Voltage Rating: 35V; Temperature Coefficient: X6S; RoHS: Yes; ComponentLink1Description: Datasheet; ComponentLink1URL: https://wmsc.lcsc.com/wmsc/upload/file/pdf/v2/lcsc/2210190600_Murata-Electronics-GRM21BC8YA106ME11L_C710990.pdf; ComponentLink2Description: JLCPCB Part URL; ComponentLink2URL: https://jlcpcb.com/partdetail/C710990; ComponentLink3Description: LCSC Part URL; ComponentLink3URL: https://lcsc.com/product-detail/Multilayer-Ceramic-Capacitors-MLCC---SMD-SMT_Murata-Electronics-Murata-Electronics-GRM21BC8YA106ME11L_C710990.html
footprint CAP-0805 (0805 (2012M) Capacitor)
pins: 1, 2

## GRM21BC8YA475ME51L
designator C?  Capacitance: 4.7uF  (hidden comment: *)
Capacitor, Ceramic (MLCC), 4.7uF, ±20%, 35V, X6S, ±20%, SMD 0805; Manufacturer: Murata Electronics; Manufacturer Part Number: GRM21BC8YA475ME51L; Package Size: 0805; JLCPCB Basic Part: No; JLCPCB Part Number: C415522; Supplier 1: LCSC; Category: Capacitors - MLCC; Supplier Part Number 1: C415522; Tolerance: ±20%; Voltage Rating: 35V; Temperature Coefficient: X6S; RoHS: Yes; ComponentLink1Description: Datasheet; ComponentLink1URL: https://wmsc.lcsc.com/wmsc/upload/file/pdf/v2/lcsc/2304140030_Murata-Electronics-GRM21BC8YA475ME51L_C415522.pdf; ComponentLink2Description: JLCPCB Part URL; ComponentLink2URL: https://jlcpcb.com/partdetail/C415522; ComponentLink3Description: LCSC Part URL; ComponentLink3URL: https://lcsc.com/product-detail/Multilayer-Ceramic-Capacitors-MLCC---SMD-SMT_Murata-Electronics-Murata-Electronics-GRM21BC8YA475ME51L_C415522.html
footprint CAP-0805 (0805 (2012M) Capacitor)
pins: 1, 2
